# Altium footprint library picoprint_library.PcbLib: 102 footprints (part 4 of 7)
Each footprint in its own frame and in the unit in brackets; x right, y up, seen from the top. Pads: shape width x height; smd on the part's side, far side on the other; paste and mask are expansions set on the pad; w line width, h text height; cw(c..) or ccw(c..) is an arc to the next point about the centre after c.
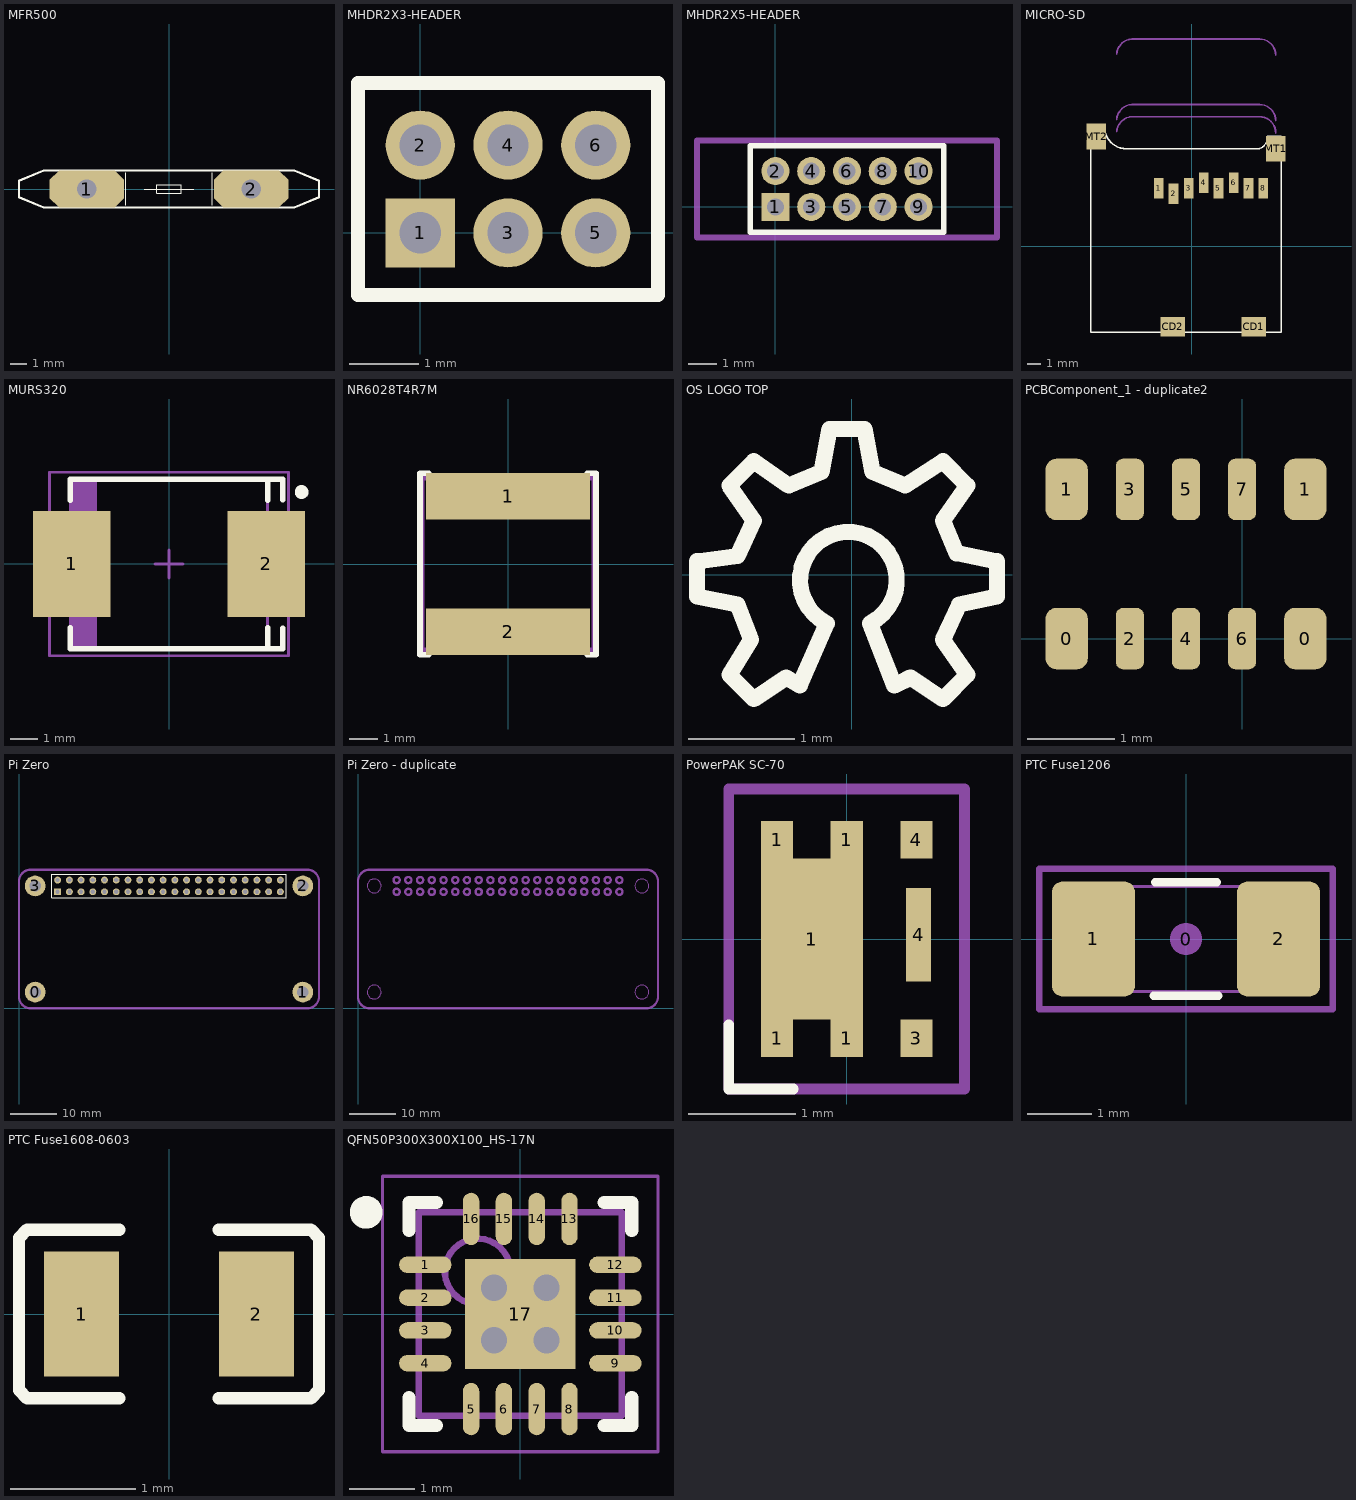
[diagram p3: the footprints below, top view; thin cyan lines are the x and y axes]

## MFR500 [mm]
pads (2):
  oct 4.6x2.3 hole 1.2: 1(-5.08,0) 2(5.08,0)
Top Overlay:
  lines w0.051: -2.667,-1.016 -2.667,1.016 ; -1.524,0 1.524,0 ; 2.667,-1.016 2.667,1.016 ; -0.762,-0.254 0.762,-0.254 0.762,0.254 -0.762,0.254 -0.762,-0.254
  lines w0.152: -9.271,-0.508 -7.747,-1.143 7.747,-1.143 9.271,-0.508 9.271,0.508 7.747,1.143 -7.747,1.143 -9.271,0.508 -9.271,-0.508

## MHDR2X3-HEADER [mm] "Connector; Header; 3x2 Position"
height 0.65
pads (6):
  rect 1x1 hole 0.6: 1(0,0)
  round 1 hole 0.6: 2(0,1.27) 3(1.27,0) 4(1.27,1.27) 5(2.54,0) 6(2.54,1.27)
Top Overlay:
  lines w0.2: -0.9,-0.9 -0.9,2.17 3.44,2.17 3.44,-0.9 -0.9,-0.9

## MHDR2X5-HEADER [mm] "Connector; Header; 5x2 Position"
height 7.6
pads (10):
  rect 1x1 hole 0.6: 1(0,0)
  round 1 hole 0.6: 2(0,1.27) 3(1.27,0) 4(1.27,1.27) 5(2.54,0) 6(2.54,1.27) 7(3.81,0) 8(3.81,1.27) 9(5.08,0) 10(5.08,1.27)
Top Overlay:
  lines w0.2: -0.9,-0.9 -0.9,2.17 5.98,2.17 5.98,-0.9 -0.9,-0.9
Mechanical 13:
  lines w0.2: -2.785,-1.085 7.865,-1.085 7.865,2.355 -2.785,2.355 -2.785,-1.085

## MICRO-SD [mil]
height 86.61
pads (12):
  rect 28x60 smd: 1(-95,168.9) 2(-52,153.15) 3(-8,168.9) 4(35,184.65) 5(78,168.9) 6(122,184.65) 7(165,168.9) 8(208,168.9)
  rect 71x56 smd: CD1(181,-232.68) CD2(-55,-232.68)
  rect 56x75 smd: MT1(244,283.07) MT2(-276,318.5)
Top Overlay:
  lines w5: -292,-248.43 260,-248.43 260,318.5 220,318.5 cw(c188.78,314.29) 193,283.07 -189,283.07 cw(c-189,346.07) -252,346.06 -292,346.06 -292,-248.43
Mechanical 1:
  lines w5: -217,332.68 cw(c-169.85,328.83) -166,375.98 197,375.98 cw(c196.88,328.86) 244,328.74 ; -217,368.11 cw(c-169.85,364.26) -166,411.42 197,411.42 cw(c196.88,364.3) 244,364.17 ; -217,557.72 cw(c-169.85,553.87) -166,601.02 197,601.02 cw(c196.88,553.9) 244,553.78
3D body "473521001_microSD.stp": height 78.74, standoff 4.72, extent -297.56,-267.64 257.56,330.79

## MURS320 [mm]
pads (2):
  rect 2.8x3.8 smd: 1(-3.5,0) 2(3.5,0)
Top Overlay:
  circle w0.25: c4.777,2.591 r0.125
  lines w0.2: -3.55,-2.3 -3.55,-3.05 3.55,-3.05 ; -3.55,2.3 -3.55,3.05 3.55,3.05 ; 3.55,-2.3 3.55,-3.05 ; 3.55,2.3 3.55,3.05 ; 4.087,-2.313 4.087,-3.05 3.55,-3.05 ; 4.087,3.05 3.55,3.05 ; 4.089,2.311 4.089,3.048
Mechanical 13:
  rectangle: -3.55,-3.05 -2.595,3.05
  lines w0.1: -3.55,-3.05 -3.55,3.05 3.55,3.05 3.55,-3.05 -3.55,-3.05
Mechanical 15:
  lines w0.1: -0.5,0 0.5,0 ; 0,-0.5 0,0.5 ; -4.3,-3.3 -4.3,3.3 4.3,3.3 4.3,-3.3 -4.3,-3.3
3D body: height 2.13, standoff 0, extent -3.55,-3.05 3.55,3.05

## NR6028T4R7M [mm]
height 3
pads (2):
  rect 5.7x1.6 smd: 1(0,2.35) 2(0,-2.35)
Top Overlay:
  lines w0.2: -2.75,-3.15 -3.05,-3.15 -3.05,3.15 -2.75,3.15 ; 2.75,-3.15 3.05,-3.15 3.05,3.15 2.75,3.15
Mechanical 1:
  lines w0.2: -3,-3 3,-3 3,3 -3,3 -3,-3
3D body "IND_TAIYO_NR6028.step": height 2.79, standoff 0, extent -3.101,-3.099 3.101,3.099

## OS LOGO TOP [mm]
Top Overlay:
  lines w0.152: -1.452,-0.203 -1.452,0.127 -1.071,0.178 -0.919,0.508 -1.147,0.838 -0.919,1.067 -0.589,0.838 -0.284,0.965 -0.208,1.372 0.123,1.372 0.199,0.965 0.504,0.838 0.859,1.067 1.088,0.838 0.859,0.508 0.986,0.203 1.367,0.127 1.367,-0.203 1.012,-0.279 0.859,-0.61 1.088,-0.94 0.859,-1.168 0.554,-0.965 0.402,-1.041 0.173,-0.457 ccw(c-0.03,-0.051) -0.233,-0.457 -0.487,-1.041 -0.614,-0.965 -0.919,-1.168 -1.147,-0.94 -0.944,-0.61 -1.071,-0.279 -1.452,-0.203

## PCBComponent_1 - duplicate [mm]

## PCBComponent_1 - duplicate1 [mm]

## PCBComponent_1 - duplicate2 [mm]
pads (10):
  rrect50% 0.48x0.7 smd: 0(-2,0) 0(0.72,0) 1(-2,1.7) 1(0.72,1.7)
  rrect50% 0.32x0.7 smd: 2(-1.28,0) 3(-1.28,1.7) 4(-0.64,0) 5(-0.64,1.7) 6(0,0) 7(0,1.7)

## Pi Zero [mm]
pads (44):
  round 4.5 hole 2.5: 0(3.5,3.5) 1(61.5,3.5) 2(61.5,26.5) 3(3.5,26.5)
  rect 1.5x1.5 hole 0.9: 1(8.37,25.23)
  round 1.5 hole 0.9: 2(8.37,27.77) 3(10.91,25.23) 4(10.91,27.77) 5(13.45,25.23) 6(13.45,27.77) 7(15.99,25.23) 8(15.99,27.77) 9(18.53,25.23) 10(18.53,27.77) 11(21.07,25.23) 12(21.07,27.77) 13(23.61,25.23) 14(23.61,27.77) 15(26.15,25.23) 16(26.15,27.77) 17(28.69,25.23) 18(28.69,27.77) 19(31.23,25.23) 20(31.23,27.77) 21(33.77,25.23) 22(33.77,27.77) 23(36.31,25.23) 24(36.31,27.77) 25(38.85,25.23) 26(38.85,27.77) 27(41.39,25.23) 28(41.39,27.77) 29(43.93,25.23) 30(43.93,27.77) 31(46.47,25.23) 32(46.47,27.77) 33(49.01,25.23) 33(54.09,25.23) 34(49.01,27.77) 34(54.09,27.77) 35(51.55,25.23) 35(56.63,25.23) 36(51.55,27.77) 36(56.63,27.77)
Top Overlay:
  lines w0.2: 57.87,23.96 7.1,23.96 7.1,29.04 57.87,29.04 ; 57.9,23.96 57.9,29.04
Mechanical 1:
  lines w0.5: 0,2.5 ccw(c2.5,2.5) 2.5,0 62.5,0 ccw(c62.5,2.5) 65,2.5 65,27.5 ccw(c62.5,27.5) 62.5,30 2.5,30 ccw(c2.5,27.5) 0,27.5 0,2.5
3D body "DS1021-2x10SF11.stp": height 8.6, standoff -3, extent 32.5,23.96 57.9,29.04
3D body "DS1021-2x10SF11.stp": height 8.6, standoff -3, extent 7.1,23.96 32.5,29.04

## Pi Zero - duplicate [mm]
height 5
Mechanical 1:
  circle w0.5: c49.01,27.77 r0.671
  circle w0.5: c51.55,27.77 r0.671
  circle w0.5: c54.09,27.77 r0.671
  circle w0.5: c56.63,27.77 r0.671
  circle w0.5: c49.01,25.23 r0.671
  circle w0.5: c51.55,25.23 r0.671
  circle w0.5: c54.09,25.23 r0.671
  circle w0.5: c56.63,25.23 r0.671
  circle w0.5: c38.85,25.23 r0.671
  circle w0.5: c41.39,25.23 r0.671
  circle w0.5: c43.93,25.23 r0.671
  circle w0.5: c46.47,25.23 r0.671
  circle w0.5: c38.85,27.77 r0.671
  circle w0.5: c41.39,27.77 r0.671
  circle w0.5: c43.93,27.77 r0.671
  circle w0.5: c46.47,27.77 r0.671
  circle w0.5: c28.69,27.77 r0.671
  circle w0.5: c31.23,27.77 r0.671
  circle w0.5: c33.77,27.77 r0.671
  circle w0.5: c36.31,27.77 r0.671
  circle w0.5: c28.69,25.23 r0.671
  circle w0.5: c31.23,25.23 r0.671
  circle w0.5: c33.77,25.23 r0.671
  circle w0.5: c36.31,25.23 r0.671
  circle w0.5: c18.53,27.77 r0.671
  circle w0.5: c21.07,27.77 r0.671
  circle w0.5: c23.61,27.77 r0.671
  circle w0.5: c26.15,27.77 r0.671
  circle w0.5: c18.53,25.23 r0.671
  circle w0.5: c21.07,25.23 r0.671
  circle w0.5: c23.61,25.23 r0.671
  circle w0.5: c26.15,25.23 r0.671
  circle w0.5: c8.37,25.23 r0.671
  circle w0.5: c10.91,25.23 r0.671
  circle w0.5: c13.45,25.23 r0.671
  circle w0.5: c15.99,25.23 r0.671
  circle w0.5: c15.99,27.77 r0.671
  circle w0.5: c13.45,27.77 r0.671
  circle w0.5: c10.91,27.77 r0.671
  circle w0.5: c8.37,27.77 r0.671
  circle w0.1: c3.5,26.5 r1.5
  circle w0.1: c3.5,3.5 r1.5
  circle w0.1: c61.5,3.5 r1.5
  circle w0.1: c61.5,26.5 r1.5
  lines w0.5: 0,2.5 ccw(c2.5,2.5) 2.5,0 62.5,0 ccw(c62.5,2.5) 65,2.5 65,27.5 ccw(c62.5,27.5) 62.5,30 2.5,30 ccw(c2.5,27.5) 0,27.5 0,2.5

## PowerPAK SC-70 [mm]
pads (8):
  rect 0.3x0.35 smd: 1(-0.65,-0.925) 1(-0.65,0.925) 1(0,-0.925) 1(0,0.925) 3(0.65,-0.925) 4(0.65,0.925)
  rect 0.95x1.5 smd: 1(-0.325,0)
  rect 0.235x0.87 smd: 4(0.67,0.04)
Top Overlay:
  lines w0.1: -1.1,-0.8 -1.1,-1.4 -0.5,-1.4
Mechanical 15:
  lines w0.1: -1.1,-1.4 -1.1,1.4 1.1,1.4 1.1,-1.4 -1.1,-1.4
3D body "User Library-SC70-6L.step": height 0.75, standoff -0.03, extent -1.025,-1.025 1.025,1.025

## PTC Fuse1206 [mm]
pads (3):
  round 0.508 on Mech15: 0(0,0)
  rrect25% 1.3x1.8 smd: 1(-1.45,0) 2(1.45,0)
Top Overlay:
  lines w0.127: -0.508,-0.889 0.508,-0.889 ; -0.483,0.889 0.483,0.889
Mechanical 13:
  lines w0.05: 1.025,-0.824 -1.025,-0.824 1.025,-0.824 ; -1.625,-0.825 -1.025,-0.825 -1.025,0.825 -1.625,0.825 -1.625,-0.825 ; -1.025,0.824 1.025,0.824 -1.025,0.824 ; 1.025,-0.825 1.025,0.825 1.625,0.825 1.625,-0.825 1.025,-0.825
Mechanical 15:
  lines w0.1: -2.3,-1.1 -2.3,1.1 2.3,1.1 2.3,-1.1 -2.3,-1.1
3D body "RES 1206 (3216 metric).STEP": height 0.69, standoff -0.01, extent -1.625,-0.825 1.625,0.825

## PTC Fuse1608-0603 [mm]
pads (2):
  rect 0.6x1 smd: 1(-0.7,0) 2(0.7,0)
Top Overlay:
  lines w0.1: -0.4,-0.675 -1.135,-0.675 -1.2,-0.61 -1.2,0.61 -1.135,0.675 -0.4,0.675 ; 0.4,-0.675 1.135,-0.675 1.2,-0.61 1.2,0.61 1.135,0.675 0.4,0.675
3D body "68912.stp": height 0.48, standoff 0, extent -0.825,-0.425 0.825,0.425

## QFN50P300X300X100_HS-17N [mm] "QFN, 16-Leads, Body 3.00x3.00mm, Pitch 0.50mm, Thermal Pad 1.68x1.68mm, IPC Medium Density"
height 1
pads (17):
  oval 0.8x0.25 smd: 1(-1.45,0.75) 2(-1.45,0.25) 3(-1.45,-0.25) 4(-1.45,-0.75) 9(1.45,-0.75) 10(1.45,-0.25) 11(1.45,0.25) 12(1.45,0.75)
  oval 0.25x0.8 smd: 5(-0.75,-1.45) 6(-0.25,-1.45) 7(0.25,-1.45) 8(0.75,-1.45) 13(0.75,1.45) 14(0.25,1.45) 15(-0.25,1.45) 16(-0.75,1.45)
  rect 1.68x1.68 smd: 17(0,0)
via 0.4,0.4 diameter 0.8 hole 0.4
via -0.4,0.4 diameter 0.8 hole 0.4
via -0.4,-0.4 diameter 0.8 hole 0.4
via 0.4,-0.4 diameter 0.8 hole 0.4
Top Overlay:
  circle w0.25: c-2.35,1.55 r0.125
  lines w0.2: -1.7,-1.275 -1.7,-1.7 -1.275,-1.7 ; -1.7,1.275 -1.7,1.7 -1.275,1.7 ; 1.275,-1.7 1.7,-1.7 1.7,-1.275 ; 1.275,1.7 1.7,1.7 1.7,1.275
Mechanical 13:
  circle w0.1: c-0.65,0.65 r0.5
  lines w0.1: -1.55,-1.55 -1.55,1.55 1.55,1.55 1.55,-1.55 -1.55,-1.55
Mechanical 15:
  lines w0.05: -2.1,-2.1 -2.1,2.1 2.1,2.1 2.1,-2.1 -2.1,-2.1
  lines w0.1: -0.5,0 0.5,0 ; 0,-0.5 0,0.5
3D body "QFN50P300X300X100_HS-17N.step": height 1, standoff 0, extent -1.551,-1.551 1.551,1.551